# Altium footprint library STM32F405.PcbLib: 36 footprints (part 2 of 3)
Each footprint in its own frame and in the unit in brackets; x right, y up, seen from the top. Pads: shape width x height; smd on the part's side, far side on the other; paste and mask are expansions set on the pad; w line width, h text height; cw(c..) or ccw(c..) is an arc to the next point about the centre after c.
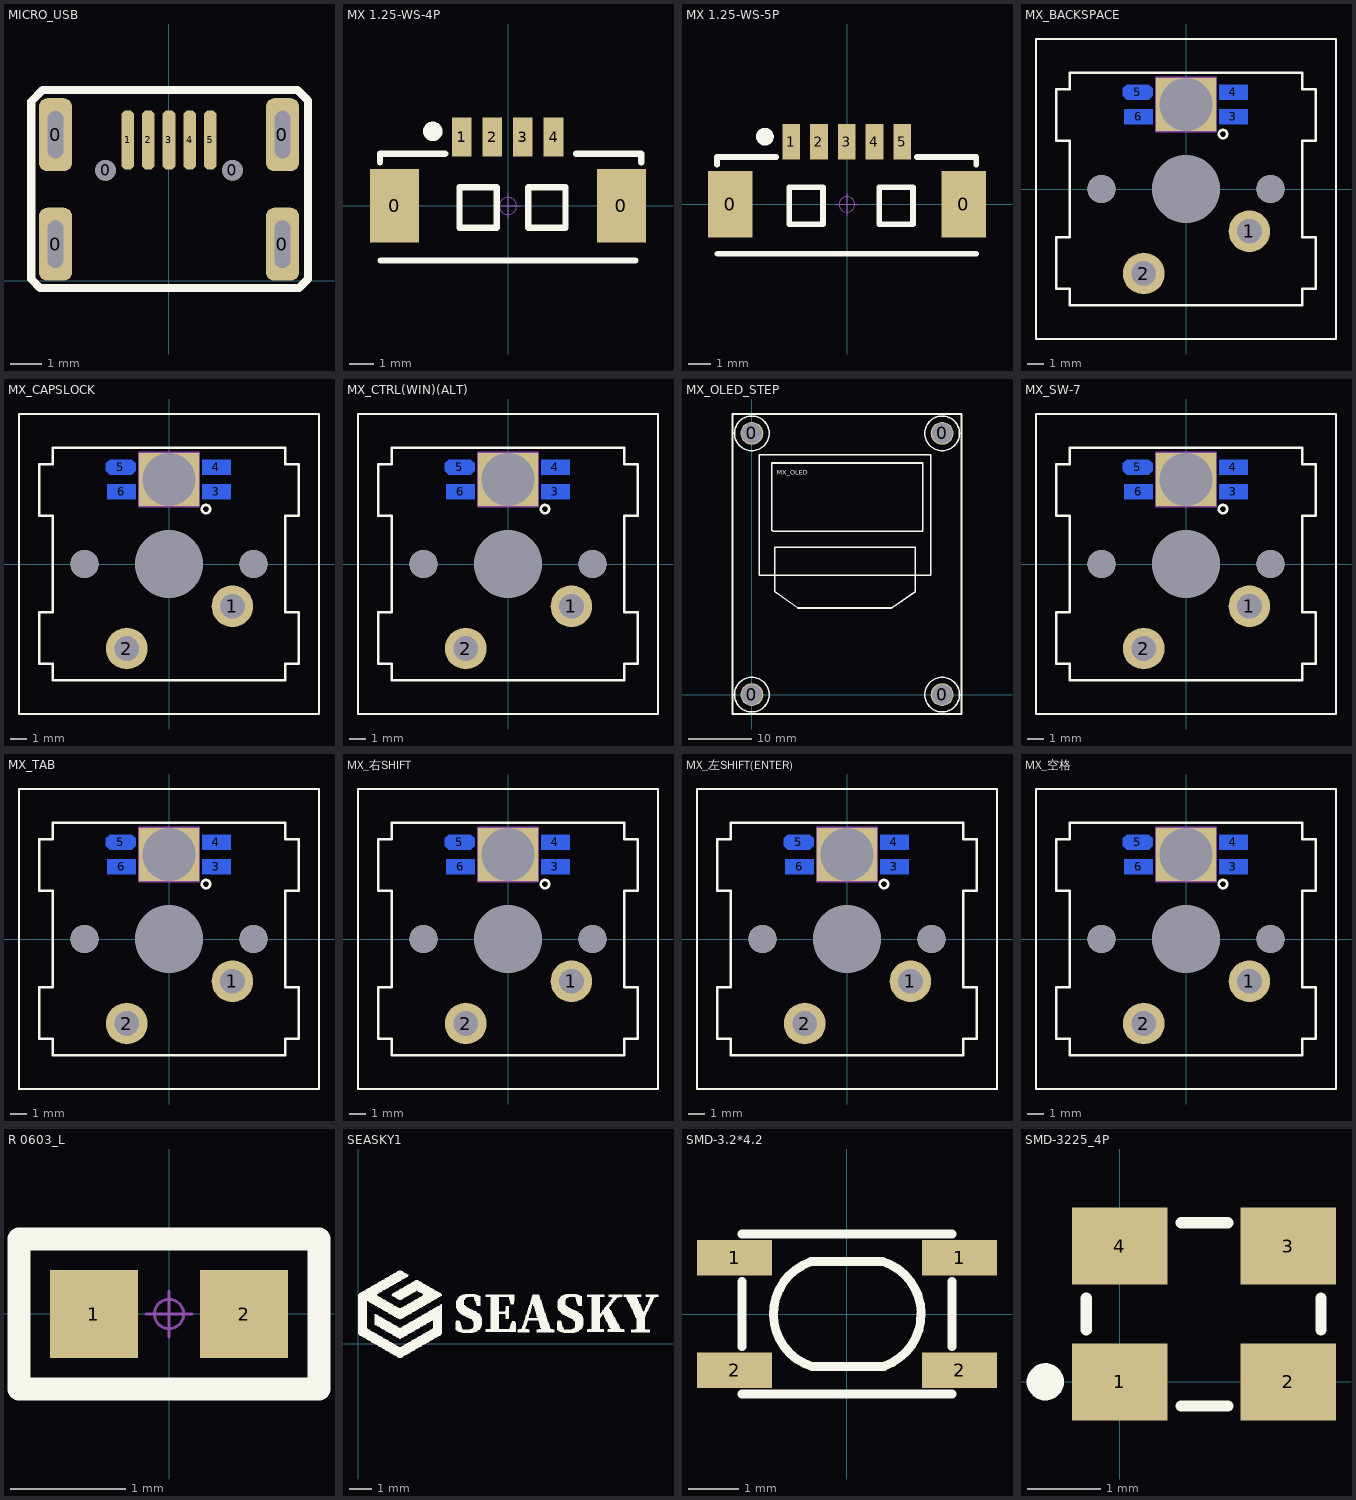
[diagram p1: the footprints below, top view; thin cyan lines are the x and y axes]

## MICRO_USB [mm]
pads (11):
  rrect50% 1.05x2.3 hole 0.5 slot 1.5 at 90 deg: 0(-3.575,4.6) 0(-3.575,1.15) 0(3.575,1.15) 0(3.575,4.6)
  round 0.65 hole 0.65 unplated: 0(-2,3.475) 0(2,3.475)
  oct 0.4x1.85 smd: 1(-1.3,4.434) 2(-0.65,4.434) 3(0,4.434) 4(0.65,4.434) 5(1.3,4.434)
Top Overlay:
  lines w0.254: -4.34,0.05 -4.34,5.65 -3.98,6.01 4.05,6.01 4.38,5.68 4.38,0.06 4.09,-0.23 -4.06,-0.23 -4.34,0.05
3D body "USB micro_D.STEP": height 2.79, standoff -0.95, extent -3.96,-1.62 4.01,5.08

## MX 1.25-WS-4P [mm] "长：10.15mm，宽：4.2mm，高：3.4mm"
height 10
pads (6):
  rect 2x3 smd: 0(-4.632,0) 0(4.632,0)
  rect 0.8x1.6 smd: 1(-1.889,2.811) 2(-0.639,2.811) 3(0.611,2.811) 4(1.861,2.811)
Top Overlay:
  circle w0.4: c-3.074,3.048 r0.2
  lines w0.254: -5.233,1.778 -5.233,2.134 -2.566,2.134 ; -5.206,-2.228 5.201,-2.228 ; 2.782,2.134 5.449,2.134 5.449,1.778 ; -1.982,-0.889 -0.458,-0.889 -0.458,0.762 -1.982,0.762 -1.982,-0.889 ; 0.826,-0.889 2.35,-0.889 2.35,0.762 0.826,0.762 0.826,-0.889
Mechanical 15:
  circle w0.05: c0,0 r0.35
  lines w0.05: -0.5,0 0.5,0 ; 0,-0.5 0,0.5
3D body "MOLEX1.25-WS-4P.STEP": height 3.4, standoff 0, extent -5.075,-2.1 5.075,3.09

## MX 1.25-WS-5P [mm] "长：11.4mm，宽：4.2mm，高：3.4mm"
pads (7):
  rect 2x3 smd: 0(-5.257,0) 0(5.257,0)
  rect 0.8x1.6 smd: 1(-2.514,2.811) 2(-1.264,2.811) 3(-0.014,2.811) 4(1.236,2.811) 5(2.486,2.811)
Top Overlay:
  circle w0.4: c-3.699,3.048 r0.2
  lines w0.254: -5.858,1.778 -5.858,2.134 -3.191,2.134 ; -5.831,-2.228 5.826,-2.228 ; 3.153,2.134 5.82,2.134 5.82,1.778 ; -2.607,-0.889 -2.607,0.762 -1.083,0.762 -1.083,-0.889 -2.607,-0.889 ; 1.451,-0.889 1.451,0.762 2.975,0.762 2.975,-0.889 1.451,-0.889
Mechanical 15:
  circle w0.05: c0,0 r0.35
  lines w0.05: -0.5,0 0.5,0 ; 0,-0.5 0,0.5
3D body "MOLEX1.25-WS-5P.STEP": height 3.4, standoff 0, extent -5.7,-2.1 5.7,3.09

## MX_BACKSPACE [mm]
pads (10):
  round 2.5 hole 1.5: 1(3.81,-2.54) 2(-2.54,-5.08)
  rect 1.7x0.9 smd far side: 3(2.85,4.33) 4(2.85,5.83) 6(-2.85,4.33)
  oct 1.8x0.9 smd far side: 5(-2.9,5.83)
  round 1.702 hole 1.702: ""(-5.08,0) ""(5.08,0)
  round 4.064 hole 4.064: ""(0,0)
  rect 3.6x3.2 hole 3.2 square: ""(0,5.08)
Top Overlay:
  circle w0.15: c2.222,3.302 r0.25
  lines w0.15: -9.017,-9.017 9.017,-9.017 9.017,9.017 -9.017,9.017 -9.017,-9.017
  lines w0.152: -7.8,-6 -7.8,-2.899 -7,-2.899 -7,2.899 -7.8,2.899 -7.8,6 -7,6 -7,7 7,7 7,6 7.799,6 7.799,2.899 7,2.899 7,-2.899 7.799,-2.899 7.799,-6 7,-6 7,-7 -7,-7 -7,-6 -7.8,-6
Mechanical 1:
  lines w0.15: -1.8,3.48 1.8,3.48 1.8,6.68 -1.8,6.68 -1.8,3.48
3D body "凯?": height 2.94, standoff -16.26, extent -7.8,-7.8 7.8,7.8
3D body "User Library-Led_3528_SingleColor.STEP": height 1.39, standoff -0.51, extent -1.75,3.68 1.75,6.48
3D body "MX_Backspace.STEP": height 23.11, standoff 12, extent -18.525,-9 18.525,9

## MX_CAPSLOCK [mm]
pads (10):
  round 2.5 hole 1.5: 1(3.796,-2.538) 2(-2.554,-5.078)
  rect 1.7x0.9 smd far side: 3(2.836,4.332) 4(2.836,5.832) 6(-2.864,4.332)
  oct 1.8x0.9 smd far side: 5(-2.914,5.832)
  round 1.702 hole 1.702: ""(-5.094,0.002) ""(5.066,0.002)
  round 4.064 hole 4.064: ""(-0.014,0.002)
  rect 3.6x3.2 hole 3.2 square: ""(-0.014,5.082)
Top Overlay:
  circle w0.15: c2.209,3.304 r0.25
  lines w0.15: -9.031,-9.015 -9.031,9.019 9.003,9.019 9.003,-9.015 -9.031,-9.015
  lines w0.152: -7.814,-5.998 -7.014,-5.998 -7.014,-6.999 6.986,-6.999 6.986,-5.998 7.785,-5.998 7.785,-2.898 6.986,-2.898 6.986,2.901 7.785,2.901 7.785,6.001 6.986,6.001 6.986,7.002 -7.014,7.002 -7.014,6.001 -7.814,6.001 -7.814,2.901 -7.014,2.901 -7.014,-2.898 -7.814,-2.898 -7.814,-5.998
Mechanical 1:
  lines w0.15: -1.814,3.482 -1.814,6.682 1.786,6.682 1.786,3.482 -1.814,3.482
3D body "凯?": height 2.94, standoff -16.26, extent -7.814,-7.798 7.786,7.802
3D body "MX_CapsLock.STEP": height 23.11, standoff 12, extent -16.144,-8.998 16.116,9.002
3D body "User Library-Led_3528_SingleColor.STEP": height 1.39, standoff -0.51, extent -1.763,3.682 1.736,6.482

## MX_CTRL(WIN)(ALT) [mm]
pads (10):
  round 2.5 hole 1.5: 1(3.789,-2.526) 2(-2.561,-5.066)
  rect 1.7x0.9 smd far side: 3(2.829,4.344) 4(2.829,5.844) 6(-2.871,4.344)
  oct 1.8x0.9 smd far side: 5(-2.921,5.844)
  round 1.702 hole 1.702: ""(-5.101,0.014) ""(5.059,0.014)
  round 4.064 hole 4.064: ""(-0.021,0.014)
  rect 3.6x3.2 hole 3.2 square: ""(-0.021,5.094)
Top Overlay:
  circle w0.15: c2.201,3.316 r0.25
  lines w0.15: -9.038,-9.003 -9.038,9.031 8.996,9.031 8.996,-9.003 -9.038,-9.003
  lines w0.152: -7.822,-5.986 -7.021,-5.986 -7.021,-6.987 6.978,-6.987 6.978,-5.986 7.777,-5.986 7.777,-2.886 6.978,-2.886 6.978,2.913 7.777,2.913 7.777,6.014 6.978,6.014 6.978,7.014 -7.021,7.014 -7.021,6.014 -7.822,6.014 -7.822,2.913 -7.021,2.913 -7.021,-2.886 -7.822,-2.886 -7.822,-5.986
Mechanical 1:
  lines w0.15: -1.821,3.494 1.779,3.494 1.779,6.694 -1.821,6.694 -1.821,3.494
3D body "凯?": height 2.94, standoff -16.26, extent -7.821,-7.786 7.779,7.814
3D body "User Library-Led_3528_SingleColor.STEP": height 1.39, standoff -0.51, extent -1.771,3.694 1.729,6.494
3D body "MX_Ctrl(Win)(Alt).STEP": height 22.5, standoff 12, extent -11.381,-8.986 11.339,9.014

## MX_OLED_STEP [mm]
pads (4):
  round 3.6 hole 3.2 unplated: 0(0,0) 0(0,41.148) 0(29.972,0) 0(29.972,41.148)
Top Overlay:
  circle w0.254: c0,41.148 r2.728
  circle w0.254: c29.972,41.148 r2.728
  circle w0.254: c29.972,0 r2.728
  circle w0.254: c0,0 r2.728
  lines w0.254: 22.06,13.652 7.259,13.652 3.637,16.187 3.637,23.241 25.735,23.241 25.735,16.231 22.083,13.675 ; -3.048,-3.048 33.02,-3.048 33.02,44.196 -3.048,44.196 -3.048,-3.048 ; 1.186,18.796 1.186,37.795 28.148,37.795 28.148,18.796 1.186,18.796 ; 3.154,25.908 3.332,25.73 26.903,25.73 26.928,25.705 26.928,36.474 3.154,36.474 3.154,25.908
  text "MX_OLED" at 3.891,34.29 h1.27
3D body "M3x5+6.STEP": height 5.05, standoff -5.95, extent -2.698,-2.35 2.698,2.35
3D body "M3x5+6.STEP": height 5.05, standoff -5.95, extent 27.274,-2.35 32.67,2.35
3D body "M3x5+6.STEP": height 5.05, standoff -5.95, extent -2.698,38.798 2.698,43.498
3D body "M3x5+6.STEP": height 5.05, standoff -5.95, extent 27.274,38.798 32.67,43.498
3D body "oled.step": height 14.55, standoff 3.3, extent -3.048,-3.048 33.02,44.196

## MX_SW-7 [mm] "with Fixation pins  1-Pole w/Diode"
pads (10):
  round 2.5 hole 1.5: 1(3.81,-2.54) 2(-2.54,-5.08)
  rect 1.7x0.9 smd far side: 3(2.85,4.33) 4(2.85,5.83) 6(-2.85,4.33)
  oct 1.8x0.9 smd far side: 5(-2.9,5.83)
  round 1.702 hole 1.702: ""(-5.08,0) ""(5.08,0)
  round 4.064 hole 4.064: ""(0,0)
  rect 3.6x3.2 hole 3.2 square: ""(0,5.08)
Top Overlay:
  circle w0.15: c2.222,3.302 r0.25
  lines w0.15: -9.017,-9.017 -9.017,9.017 9.017,9.017 9.017,-9.017 -9.017,-9.017
  lines w0.152: -7.8,-6 -7,-6 -7,-7 7,-7 7,-6 7.799,-6 7.799,-2.899 7,-2.899 7,2.899 7.799,2.899 7.799,6 7,6 7,7 -7,7 -7,6 -7.8,6 -7.8,2.899 -7,2.899 -7,-2.899 -7.8,-2.899 -7.8,-6
Mechanical 1:
  lines w0.15: -1.8,3.48 1.8,3.48 1.8,6.68 -1.8,6.68 -1.8,3.48
3D body "凯?": height 2.94, standoff -16.26, extent -7.8,-7.8 7.8,7.8
3D body "User Library-Led_3528_SingleColor.STEP": height 1.39, standoff -0.51, extent -1.75,3.68 1.75,6.48
3D body "MX_普通键.STEP": height 22.5, standoff 12, extent -9,-9 9,9

## MX_TAB [mm]
pads (10):
  round 2.5 hole 1.5: 1(3.81,-2.54) 2(-2.54,-5.08)
  rect 1.7x0.9 smd far side: 3(2.85,4.33) 4(2.85,5.83) 6(-2.85,4.33)
  oct 1.8x0.9 smd far side: 5(-2.9,5.83)
  round 1.702 hole 1.702: ""(-5.08,0) ""(5.08,0)
  round 4.064 hole 4.064: ""(0,0)
  rect 3.6x3.2 hole 3.2 square: ""(0,5.08)
Top Overlay:
  circle w0.15: c2.222,3.302 r0.25
  lines w0.15: -9.017,-9.017 -9.017,9.017 9.017,9.017 9.017,-9.017 -9.017,-9.017
  lines w0.152: -7.8,-6 -7,-6 -7,-7 7,-7 7,-6 7.799,-6 7.799,-2.899 7,-2.899 7,2.899 7.799,2.899 7.799,6 7,6 7,7 -7,7 -7,6 -7.8,6 -7.8,2.899 -7,2.899 -7,-2.899 -7.8,-2.899 -7.8,-6
Mechanical 1:
  lines w0.15: -1.8,3.48 -1.8,6.68 1.8,6.68 1.8,3.48 -1.8,3.48
3D body "凯?": height 2.94, standoff -16.26, extent -7.8,-7.8 7.8,7.8
3D body "MX_Tab.STEP": height 23.11, standoff 12, extent -13.763,-9 13.763,9
3D body "User Library-Led_3528_SingleColor.STEP": height 1.39, standoff -0.51, extent -1.75,3.68 1.75,6.48

## MX_右SHIFT [mm]
pads (10):
  round 2.5 hole 1.5: 1(3.81,-2.54) 2(-2.54,-5.08)
  rect 1.7x0.9 smd far side: 3(2.85,4.33) 4(2.85,5.83) 6(-2.85,4.33)
  oct 1.8x0.9 smd far side: 5(-2.9,5.83)
  round 1.702 hole 1.702: ""(-5.08,0) ""(5.08,0)
  round 4.064 hole 4.064: ""(0,0)
  rect 3.6x3.2 hole 3.2 square: ""(0,5.08)
Top Overlay:
  circle w0.15: c2.222,3.302 r0.25
  lines w0.15: -9.017,-9.017 9.017,-9.017 9.017,9.017 -9.017,9.017 -9.017,-9.017
  lines w0.152: -7.8,-6 -7.8,-2.899 -7,-2.899 -7,2.899 -7.8,2.899 -7.8,6 -7,6 -7,7 7,7 7,6 7.799,6 7.799,2.899 7,2.899 7,-2.899 7.799,-2.899 7.799,-6 7,-6 7,-7 -7,-7 -7,-6 -7.8,-6
Mechanical 1:
  lines w0.15: -1.8,3.48 -1.8,6.68 1.8,6.68 1.8,3.48 -1.8,3.48
3D body "凯?": height 2.94, standoff -16.26, extent -7.8,-7.8 7.8,7.8
3D body "MX_右Shift.STEP": height 23.11, standoff 12, extent -25.669,-9 25.669,9
3D body "User Library-Led_3528_SingleColor.STEP": height 1.39, standoff -0.51, extent -1.75,3.68 1.75,6.48

## MX_左SHIFT(ENTER) [mm]
pads (10):
  round 2.5 hole 1.5: 1(3.81,-2.54) 2(-2.54,-5.08)
  rect 1.7x0.9 smd far side: 3(2.85,4.33) 4(2.85,5.83) 6(-2.85,4.33)
  oct 1.8x0.9 smd far side: 5(-2.9,5.83)
  round 1.702 hole 1.702: ""(-5.08,0) ""(5.08,0)
  round 4.064 hole 4.064: ""(0,0)
  rect 3.6x3.2 hole 3.2 square: ""(0,5.08)
Top Overlay:
  circle w0.15: c2.222,3.302 r0.25
  lines w0.15: -9.017,-9.017 9.017,-9.017 9.017,9.017 -9.017,9.017 -9.017,-9.017
  lines w0.152: -7.8,-6 -7.8,-2.899 -7,-2.899 -7,2.899 -7.8,2.899 -7.8,6 -7,6 -7,7 7,7 7,6 7.799,6 7.799,2.899 7,2.899 7,-2.899 7.799,-2.899 7.799,-6 7,-6 7,-7 -7,-7 -7,-6 -7.8,-6
Mechanical 1:
  lines w0.15: -1.8,3.48 -1.8,6.68 1.8,6.68 1.8,3.48 -1.8,3.48
3D body "凯?": height 2.94, standoff -16.26, extent -7.8,-7.8 7.8,7.8
3D body "MX_左Shift(Enter).STEP": height 23.11, standoff 12, extent -20.906,-9 20.906,9
3D body "User Library-Led_3528_SingleColor.STEP": height 1.39, standoff -0.51, extent -1.75,3.68 1.75,6.48

## MX_空格 [mm]
pads (10):
  round 2.5 hole 1.5: 1(3.81,-2.54) 2(-2.54,-5.08)
  rect 1.7x0.9 smd far side: 3(2.85,4.33) 4(2.85,5.83) 6(-2.85,4.33)
  oct 1.8x0.9 smd far side: 5(-2.9,5.83)
  round 1.702 hole 1.702: ""(-5.08,0) ""(5.08,0)
  round 4.064 hole 4.064: ""(0,0)
  rect 3.6x3.2 hole 3.2 square: ""(0,5.08)
Top Overlay:
  circle w0.15: c2.222,3.302 r0.25
  lines w0.15: -9.017,-9.017 9.017,-9.017 9.017,9.017 -9.017,9.017 -9.017,-9.017
  lines w0.152: -7.8,-6 -7.8,-2.899 -7,-2.899 -7,2.899 -7.8,2.899 -7.8,6 -7,6 -7,7 7,7 7,6 7.799,6 7.799,2.899 7,2.899 7,-2.899 7.799,-2.899 7.799,-6 7,-6 7,-7 -7,-7 -7,-6 -7.8,-6
Mechanical 1:
  lines w0.15: -1.8,3.48 1.8,3.48 1.8,6.68 -1.8,6.68 -1.8,3.48
3D body "凯?": height 2.94, standoff -16.26, extent -7.8,-7.8 7.8,7.8
3D body "User Library-Led_3528_SingleColor.STEP": height 1.39, standoff -0.51, extent -1.75,3.68 1.75,6.48
3D body "MX_空格.STEP": height 23.11, standoff 12, extent -59,-9 59,9

## R 0603_L [mil] "1/10W贴片电阻                 淘宝ID:黄晶宝石"
height 177.17
pads (2):
  rect 30x30 smd: 1(-25.59,0) 2(25.59,0)
Top Overlay:
  lines w8: -51.18,-25.59 -51.18,25.59 51.18,25.59 51.18,-25.59 -51.18,-25.59
Mechanical 15:
  circle w1: c0,0 r5
  lines w1: -7.87,0 7.87,0 ; 0,-7.87 0,7.87
3D body "R 0603.STEP": height 15.79, standoff -0.13, extent -31.49,-15.74 31.5,15.75

## SEASKY1 [mm]
height 4.5
Top Overlay:
  drawing of 1027 lines, arcs and shapes, not listed

## SMD-3.2*4.2 [mm]
height 4.5
pads (4):
  rect 1.5x0.7 smd: 1(-2.25,1.125) 1(2.25,1.125) 2(-2.25,-1.125) 2(2.25,-1.125)
Top Overlay:
  lines w0.178: -2.1,-1.6 2.1,-1.6 ; -2.1,-0.65 -2.1,0.65 ; -2.1,1.6 2.1,1.6 ; -0.738,1.037 ccw(c-0.372,0) -0.7,-1.05 0.737,-1.05 ; -0.725,1.05 0.712,1.05 cw(c0.384,0) 0.75,-1.037 ; 2.1,-0.65 2.1,0.65
3D body: height 0.13, standoff 0, extent -2.735,-1.282 2.472,-0.901
3D body: height 0.13, standoff 0, extent -2.735,0.94 2.472,1.321
3D body: height 1.5, standoff 0.05, extent -2.1,-1.6 2.091,1.575
3D body: height 1.8, standoff 0.13, extent -1.306,-1.092 1.424,1.003

## SMD-3225_4P [mm]
pads (4):
  rect 1.3x1.05 smd: 1(0,0) 2(2.3,0) 3(2.3,1.85) 4(0,1.85)
Top Overlay:
  circle w0.254: c-1.016,0 r0.127
  lines w0.152: -0.457,0.711 -0.457,1.143 ; 0.838,-0.33 1.473,-0.33 ; 0.838,2.17 1.473,2.17 ; 2.743,0.711 2.743,1.143
3D body "OSC 3225-4.STEP": height 0.7, standoff -0.02, extent -0.457,-0.361 2.743,2.139